# Altium footprint library MyComponents_v2.5.PcbLib: 403 footprints (part 18 of 26)
Each footprint in its own frame and in the unit in brackets; x right, y up, seen from the top. Pads: shape width x height; smd on the part's side, far side on the other; paste and mask are expansions set on the pad; w line width, h text height; cw(c..) or ccw(c..) is an arc to the next point about the centre after c.
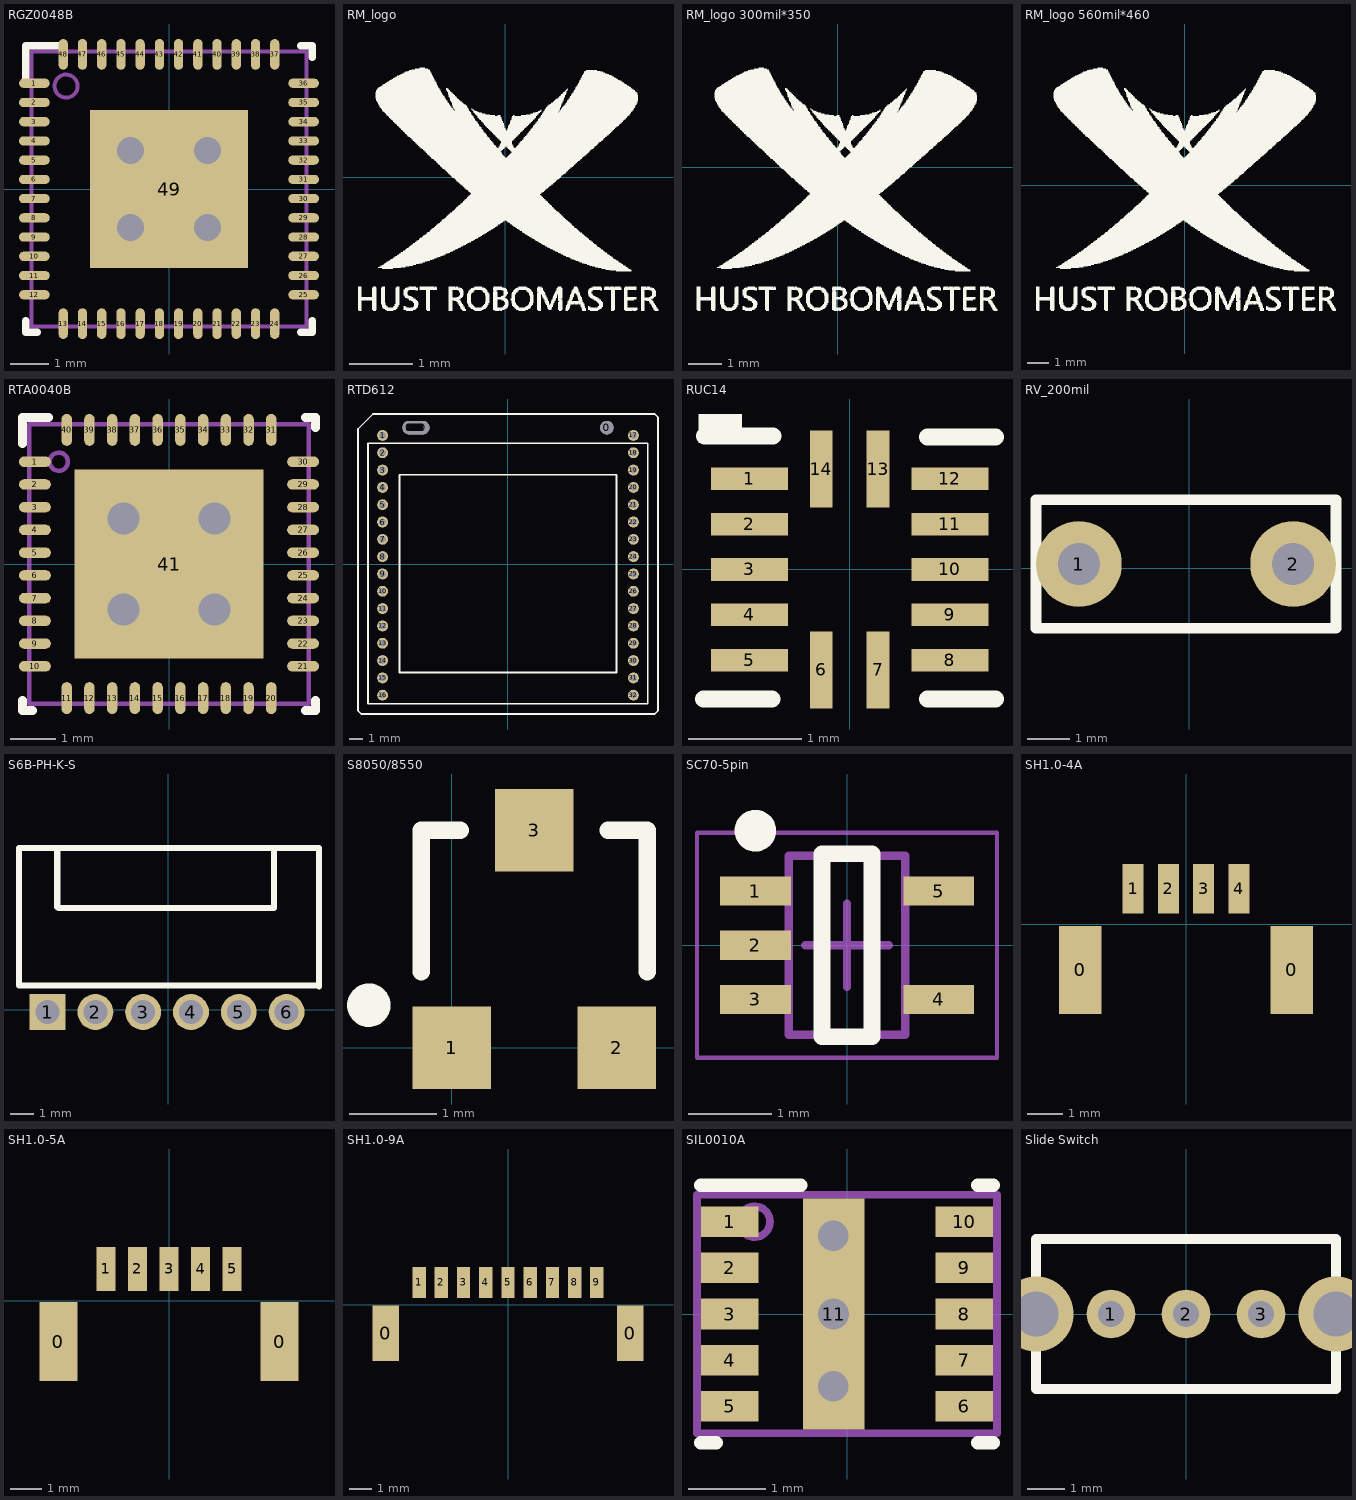
[diagram p17: the footprints below, top view; thin cyan lines are the x and y axes]

## RGZ0048B [mm] "QFN, 48-Leads, Body 7x7mm, Pitch 0.5mm, Thermal Pad 5.15x5.15mm, TI Recommended"
height 1
pads (49):
  oval 0.8x0.24 smd: 1(-3.5,2.75) 2(-3.5,2.25) 3(-3.5,1.75) 4(-3.5,1.25) 5(-3.5,0.75) 6(-3.5,0.25) 7(-3.5,-0.25) 8(-3.5,-0.75) 9(-3.5,-1.25) 10(-3.5,-1.75) 11(-3.5,-2.25) 12(-3.5,-2.75) 25(3.5,-2.75) 26(3.5,-2.25) 27(3.5,-1.75) 28(3.5,-1.25) 29(3.5,-0.75) 30(3.5,-0.25) 31(3.5,0.25) 32(3.5,0.75) 33(3.5,1.25) 34(3.5,1.75) 35(3.5,2.25) 36(3.5,2.75)
  oval 0.24x0.8 smd: 13(-2.75,-3.5) 14(-2.25,-3.5) 15(-1.75,-3.5) 16(-1.25,-3.5) 17(-0.75,-3.5) 18(-0.25,-3.5) 19(0.25,-3.5) 20(0.75,-3.5) 21(1.25,-3.5) 22(1.75,-3.5) 23(2.25,-3.5) 24(2.75,-3.5) 37(2.75,3.5) 38(2.25,3.5) 39(1.75,3.5) 40(1.25,3.5) 41(0.75,3.5) 42(0.25,3.5) 43(-0.25,3.5) 44(-0.75,3.5) 45(-1.25,3.5) 46(-1.75,3.5) 47(-2.25,3.5) 48(-2.75,3.5)
  rect 4.1x4.1 smd paste-2.575: 49(0,0)
via 1,1 diameter 1 hole 0.7
via -1,-1 diameter 1 hole 0.7
via 1,-1 diameter 1 hole 0.7
via -1,1 diameter 1 hole 0.7
Top Overlay:
  lines w0.2: -3.725,-3.425 -3.725,-3.725 -3.425,-3.725 ; -3.725,2.85 -3.725,3.725 -2.9,3.725 ; 3.425,-3.725 3.725,-3.725 3.725,-3.425 ; 3.425,3.725 3.725,3.725 3.725,3.425
Top Paste:
  region: -0.778,-0.778 -1.936,-0.778 -1.936,-1.936 -0.778,-1.936
  rectangle: 0.778,-1.936 1.936,-0.778
  rectangle: -0.579,-1.936 0.579,-0.778
  rectangle: -0.579,0.778 0.579,1.936
  rectangle: 0.778,0.778 1.936,1.936
  region: -0.778,1.936 -1.936,1.936 -1.936,0.778 -0.778,0.778
  region: -0.778,0.579 -1.936,0.579 -1.936,-0.579 -0.778,-0.579
  rectangle: 0.778,-0.579 1.936,0.579
  rectangle: -0.579,-0.579 0.579,0.579
Mechanical 5:
  circle w0.1: c-2.675,2.675 r0.3
  lines w0.1: -3.575,-3.575 -3.575,3.575 3.575,3.575 3.575,-3.575 -3.575,-3.575
3D body: height 1.01, standoff 0.5, extent -2.974,2.376 -2.376,2.974
3D body: height 1, standoff 0, extent -3.575,-3.575 3.575,3.575

## RM_logo [mm]
Top Overlay:
  drawing of 1254 lines, arcs and shapes, not listed

## RM_logo 300mil*350 [mm] "300mil*350mil"
Top Overlay:
  drawing of 1254 lines, arcs and shapes, not listed

## RM_logo 560mil*460 [mm] "560mil*460mil"
Top Overlay:
  drawing of 1254 lines, arcs and shapes, not listed

## RTA0040B [mm]
pads (41):
  oval 0.7x0.23 smd paste+0 mask+0.076: 1(-2.95,2.25) 2(-2.95,1.75) 3(-2.95,1.25) 4(-2.95,0.75) 5(-2.95,0.25) 6(-2.95,-0.25) 7(-2.95,-0.75) 8(-2.95,-1.25) 9(-2.95,-1.75) 10(-2.95,-2.25) 21(2.95,-2.25) 22(2.95,-1.75) 23(2.95,-1.25) 24(2.95,-0.75) 25(2.95,-0.25) 26(2.95,0.25) 27(2.95,0.75) 28(2.95,1.25) 29(2.95,1.75) 30(2.95,2.25)
  oval 0.23x0.7 smd paste+0 mask+0.076: 11(-2.25,-2.95) 12(-1.75,-2.95) 13(-1.25,-2.95) 14(-0.75,-2.95) 15(-0.25,-2.95) 16(0.25,-2.95) 17(0.75,-2.95) 18(1.25,-2.95) 19(1.75,-2.95) 20(2.25,-2.95) 31(2.25,2.95) 32(1.75,2.95) 33(1.25,2.95) 34(0.75,2.95) 35(0.25,2.95) 36(-0.25,2.95) 37(-0.75,2.95) 38(-1.25,2.95) 39(-1.75,2.95) 40(-2.25,2.95)
  rect 4.15x4.15 smd paste-2.062 mask+0: 41(0,0)
via 1,1 diameter 1 hole 0.7
via -1,-1 diameter 1 hole 0.7
via 1,-1 diameter 1 hole 0.7
via -1,1 diameter 1 hole 0.7
Top Overlay:
  lines w0.2: -3.225,-3 -3.225,-3.225 -3,-3.225 ; -3.225,2.65 -3.225,3.225 -2.65,3.225 ; 3,-3.225 3.225,-3.225 3.225,-3 ; 3,3.225 3.225,3.225 3.225,3
Top Paste:
  region: -0.585,0.585 -0.585,-0.585 0.585,-0.585 0.585,0.585
  region: 0.785,0.585 0.785,-0.585 1.955,-0.585 1.955,0.585
  region: -1.955,0.585 -1.955,-0.585 -0.785,-0.585 -0.785,0.585
  region: -1.955,1.955 -1.955,0.785 -0.785,0.785 -0.785,1.955
  region: 0.785,1.955 0.785,0.785 1.955,0.785 1.955,1.955
  region: -0.585,1.955 -0.585,0.785 0.585,0.785 0.585,1.955
  region: -1.955,-0.785 -1.955,-1.955 -0.785,-1.955 -0.785,-0.785
  region: 0.785,-0.785 0.785,-1.955 1.955,-1.955 1.955,-0.785
  region: -0.585,-0.785 -0.585,-1.955 0.585,-1.955 0.585,-0.785
Mechanical 13:
  circle w0.1: c-2.425,2.25 r0.2
  lines w0.1: -3.075,-3.075 3.075,-3.075 3.075,3.075 -3.075,3.075 -3.075,-3.075
3D body "WQFN40.stp": height 1, standoff 0, extent -3,-3 3,3

## RTD612 [mm] "LWIR Imaging Sensor"
pads (47):
  round 1 hole 1: 0(-7.25,10) 0(-7.175,10) 0(-7.1,10) 0(-7.025,10) 0(-6.95,10) 0(-6.875,10) 0(-6.8,10) 0(-6.725,10) 0(-6.65,10) 0(-6.575,10) 0(-6.5,10) 0(-6.425,10) 0(-6.35,10) 0(-6.25,10) 0(7.25,10)
  round 0.8 hole 0.5: 1(-9.2,9.43) 2(-9.2,8.16) 3(-9.2,6.89) 4(-9.2,5.62) 5(-9.2,4.35) 6(-9.2,3.08) 7(-9.2,1.81) 8(-9.2,0.54) 9(-9.2,-0.73) 10(-9.2,-2) 11(-9.2,-3.27) 12(-9.2,-4.54) 13(-9.2,-5.81) 14(-9.2,-7.08) 15(-9.2,-8.35) 16(-9.2,-9.62) 17(9.2,9.43) 18(9.2,8.16) 19(9.2,6.89) 20(9.2,5.62) 21(9.2,4.35) 22(9.2,3.08) 23(9.2,1.81) 24(9.2,0.54) 25(9.2,-0.73) 26(9.2,-2) 27(9.2,-3.27) 28(9.2,-4.54) 29(9.2,-5.81) 30(9.2,-7.08) 31(9.2,-8.35) 32(9.2,-9.62)
Top Overlay:
  lines w0.127: 7.95,-7.95 -7.95,-7.95 -7.95,-0.7 -7.95,6.55 7.95,6.55 7.95,-0.7 7.95,-7.925 ; 10.25,-10.25 10.25,-0.7 10.25,8.85 -10.275,8.85 -10.275,-0.7 -10.275,-10.25 10.25,-10.25 ; 10.25,-10.25 10.25,-10.25 ; -11,-10.75 -11,0 -11,9.9 -9.9,11 10.75,11 11,10.75 11,0 11,-10.75 10.75,-11 -10.75,-11 -11,-10.75

## RUC14 [mm]
pads (14):
  rect 0.68x0.2 smd paste-0.1: 1(-0.885,0.8) 2(-0.885,0.4) 3(-0.885,0) 4(-0.885,-0.4) 5(-0.885,-0.8) 8(0.885,-0.8) 9(0.885,-0.4) 10(0.885,0) 11(0.885,0.4) 12(0.885,0.8)
  rect 0.2x0.68 smd paste-0.1: 6(-0.25,-0.885) 7(0.25,-0.885) 13(0.25,0.885) 14(-0.25,0.885)
Top Overlay:
  region: -1.333,1.118 -1.333,1.372 -0.953,1.372 -0.953,1.118
  lines w0.152: -1.286,-1.143 -0.686,-1.143 ; -1.279,1.177 -0.678,1.177 ; 0.686,-1.143 1.286,-1.143 ; 0.686,1.168 1.286,1.168
Top Paste:
  region: -0.175,1.2 -0.325,1.2 -0.325,0.57 -0.175,0.57
  region: 0.325,1.2 0.175,1.2 0.175,0.57 0.325,0.57
  region: 1.2,0.875 0.57,0.875 0.57,0.725 1.2,0.725
  region: 1.2,0.475 0.57,0.475 0.57,0.325 1.2,0.325
  region: 1.2,0.075 0.57,0.075 0.57,-0.075 1.2,-0.075
  region: 1.2,-0.325 0.57,-0.325 0.57,-0.475 1.2,-0.475
  region: 1.2,-0.725 0.57,-0.725 0.57,-0.875 1.2,-0.875
  region: 0.325,-0.57 0.175,-0.57 0.175,-1.2 0.325,-1.2
  region: -0.175,-0.57 -0.325,-0.57 -0.325,-1.2 -0.175,-1.2
  region: -0.57,-0.725 -1.2,-0.725 -1.2,-0.875 -0.57,-0.875
  region: -0.57,-0.325 -1.2,-0.325 -1.2,-0.475 -0.57,-0.475
  region: -0.57,0.075 -1.2,0.075 -1.2,-0.075 -0.57,-0.075
  region: -0.57,0.475 -1.2,0.475 -1.2,0.325 -0.57,0.325
  region: -0.57,0.875 -1.2,0.875 -1.2,0.725 -0.57,0.725
Top Solder:
  region: -0.1,1.275 -0.4,1.275 -0.4,0.495 -0.1,0.495
  region: 0.4,1.275 0.1,1.275 0.1,0.495 0.4,0.495
  region: 1.275,0.95 0.495,0.95 0.495,0.65 1.275,0.65
  region: 1.275,0.55 0.495,0.55 0.495,0.25 1.275,0.25
  region: 1.275,0.15 0.495,0.15 0.495,-0.15 1.275,-0.15
  region: 1.275,-0.25 0.495,-0.25 0.495,-0.55 1.275,-0.55
  region: 1.275,-0.65 0.495,-0.65 0.495,-0.95 1.275,-0.95
  region: 0.4,-0.495 0.1,-0.495 0.1,-1.275 0.4,-1.275
  region: -0.1,-0.495 -0.4,-0.495 -0.4,-1.275 -0.1,-1.275
  region: -0.495,-0.65 -1.275,-0.65 -1.275,-0.95 -0.495,-0.95
  region: -0.495,-0.25 -1.275,-0.25 -1.275,-0.55 -0.495,-0.55
  region: -0.495,0.15 -1.275,0.15 -1.275,-0.15 -0.495,-0.15
  region: -0.495,0.55 -1.275,0.55 -1.275,0.25 -0.495,0.25
  region: -0.495,0.95 -1.275,0.95 -1.275,0.65 -0.495,0.65
3D body: height 0.6, standoff 0, extent -1.076,-1.076 1.076,1.076

## RV_200mil [mil]
pads (2):
  round 80 hole 39.37: 1(-103,4) 2(97,4)
Top Overlay:
  lines w10: -143,-56 -143,64 137,64 137,-56 -143,-56

## S6B-PH-K-S [mm]
pads (6):
  rect 1.5x1.5 hole 1: 1(-5.055,-0.102)
  round 1.5 hole 1: 2(-3.055,-0.102) 3(-1.055,-0.102) 4(0.945,-0.102) 5(2.945,-0.102) 6(4.945,-0.102)
Top Overlay:
  lines w0.254: -4.648,6.68 -4.648,4.293 -4.597,4.242 4.42,4.242 4.42,6.629 ; -6.248,1.016 6.248,1.016 6.299,0.965 6.299,6.756 -6.248,6.756 -6.248,1.016

## S8050/8550 [mm] "贴片三极管8050/8550"
pads (3):
  rect 0.9x0.95 smd: 1(0,0) 2(1.9,0) 3(0.95,2.5)
Top Overlay:
  circle w0.25: c-0.953,0.488 r0.125
  lines w0.2: -0.35,0.875 -0.35,2.5 0.1,2.5 ; 1.8,2.5 2.25,2.5 2.25,0.875

## SC70-5pin [mm] "SOT23, 5-Leads, Body 2.00x2.10mm, Pitch 0.65mm, IPC Medium Density"
height 1.1
pads (5):
  rect 0.85x0.35 smd: 1(-1.1,0.65) 2(-1.1,0) 3(-1.1,-0.65) 4(1.1,-0.65) 5(1.1,0.65)
Top Overlay:
  circle w0.25: c-1.1,1.375 r0.125
  lines w0.2: -0.3,-1.1 -0.3,1.1 0.3,1.1 0.3,-1.1 -0.3,-1.1
Mechanical 13:
  lines w0.1: -0.7,-1.075 0.7,-1.075 0.7,1.075 -0.7,1.075 -0.7,-1.075
Mechanical 15:
  lines w0.05: -1.8,-1.35 1.8,-1.35 1.8,1.35 -1.8,1.35 -1.8,-1.35
  lines w0.1: -0.5,0 0.5,0 ; 0,-0.5 0,0.5
3D body: height 1.1, standoff 0.1, extent -0.7,-1.075 0.7,1.075

## SH1.0-4A [mm]
pads (6):
  rect 1.2x2.5 smd: 0(-3,-1.3) 0(3,-1.3)
  rect 0.6x1.4 smd: 1(-1.5,1) 2(-0.5,1) 3(0.5,1) 4(1.5,1)
3D body "SH1.0_4p_smt.stp": height 2.92, standoff -0.68, extent -3.15,-3 3.15,1.3

## SH1.0-5A [mm]
pads (7):
  rect 1.2x2.5 smd: 0(-3.5,-1.3) 0(3.5,-1.3)
  rect 0.6x1.4 smd: 1(-2,1) 2(-1,1) 3(0,1) 4(1,1) 5(2,1)
3D body "SH1.0_5p_smt.stp": height 2.92, standoff -0.68, extent -3.7,-3.25 3.6,1.05

## SH1.0-9A [mm]
pads (11):
  rect 1.2x2.5 smd: 0(-5.5,-1.3) 0(5.5,-1.3)
  rect 0.6x1.4 smd: 1(-4,1) 2(-3,1) 3(-2,1) 4(-1,1) 5(0,1) 6(1,1) 7(2,1) 8(3,1) 9(4,1)
3D body "SH1.0_9p_smt.stp": height 2.92, standoff -0.68, extent -5.65,-3 5.65,1.3

## SIL0010A [mm]
pads (11):
  rect 0.75x0.4 smd paste-0.05 mask-0.051: 1(-1.525,1.2) 2(-1.525,0.6) 3(-1.525,0) 4(-1.525,-0.6) 5(-1.525,-1.2) 6(1.525,-1.2) 7(1.525,-0.6) 8(1.525,0) 9(1.525,0.6) 10(1.525,1.2)
  rect 0.8x3 smd paste-1.487 mask-0.051: 11(-0.175,0)
via -0.178,1.016 diameter 0.7 hole 0.4
via -0.175,0 diameter 0.7 hole 0.4
via -0.178,-0.94 diameter 0.7 hole 0.4
Top Overlay:
  lines w0.178: -1.9,-1.675 -1.7,-1.675 ; -1.9,1.675 -0.6,1.675 ; 1.7,-1.675 1.9,-1.675 ; 1.7,1.675 1.9,1.675
Top Paste:
  region: -0.524,-0.377 -0.525,-0.367 -0.525,0.367 -0.524,0.377 -0.521,0.386 -0.517,0.395 -0.511,0.402 -0.503,0.408 -0.495,0.413 -0.486,0.416 -0.476,0.416 0.126,0.416 0.136,0.416 0.145,0.413 0.153,0.408 0.161,0.402 0.167,0.395 0.171,0.386 0.174,0.377 0.175,0.367 0.175,-0.367 0.174,-0.377 0.171,-0.386 0.167,-0.395 0.161,-0.402 0.153,-0.408 0.145,-0.413 0.136,-0.416 0.126,-0.416 -0.476,-0.416 -0.486,-0.416 -0.495,-0.413 -0.503,-0.408 -0.511,-0.402 -0.517,-0.395 -0.521,-0.386
  region: -0.524,-1.407 -0.525,-1.398 -0.525,-0.663 -0.524,-0.653 -0.521,-0.644 -0.517,-0.635 -0.511,-0.628 -0.503,-0.622 -0.495,-0.617 -0.486,-0.614 -0.476,-0.613 0.126,-0.613 0.136,-0.614 0.145,-0.617 0.153,-0.622 0.161,-0.628 0.167,-0.635 0.171,-0.644 0.174,-0.653 0.175,-0.663 0.175,-1.398 0.174,-1.407 0.171,-1.416 0.167,-1.425 0.161,-1.432 0.153,-1.438 0.145,-1.443 0.136,-1.446 0.126,-1.446 -0.476,-1.446 -0.486,-1.446 -0.495,-1.443 -0.503,-1.438 -0.511,-1.432 -0.517,-1.425 -0.521,-1.416
  region: -0.524,0.653 -0.525,0.663 -0.525,1.398 -0.524,1.407 -0.521,1.416 -0.517,1.425 -0.511,1.432 -0.503,1.438 -0.495,1.443 -0.486,1.446 -0.476,1.446 0.126,1.446 0.136,1.446 0.145,1.443 0.153,1.438 0.161,1.432 0.167,1.425 0.171,1.416 0.174,1.407 0.175,1.398 0.175,0.663 0.174,0.653 0.171,0.644 0.167,0.635 0.161,0.628 0.153,0.622 0.145,0.617 0.136,0.614 0.126,0.613 -0.476,0.613 -0.486,0.614 -0.495,0.617 -0.503,0.622 -0.511,0.628 -0.517,0.635 -0.521,0.644
Mechanical 13:
  circle w0.1: c-1.2,1.2 r0.2
  lines w0.1: -1.95,-1.55 1.95,-1.55 1.95,1.55 -1.95,1.55 -1.95,-1.55
3D body "SIL0010A.stp": height 1.49, standoff 0, extent -1.9,-1.476 1.9,1.524

## Slide Switch [mm]
pads (3):
  round 1.3 hole 0.7: 1(-2,0) 2(0,0) 3(2,0)
via -4,0 diameter 2 hole 1.2
via 4,0 diameter 2 hole 1.2
Top Overlay:
  lines w0.254: -4,-2 4,-2 4,2 -4,2 -4,-2
3D body "Slide Switch-3Ppin-SPDT-0_3A.step": height 6.5, standoff -5, extent -4.25,-1.9 4.25,1.8